# Altium footprint library POT_TH.PcbLib: 65 footprints (part 4 of 5)
Each footprint in its own frame and in the unit in brackets; x right, y up, seen from the top. Pads: shape width x height; smd on the part's side, far side on the other; paste and mask are expansions set on the pad; w line width, h text height; cw(c..) or ccw(c..) is an arc to the next point about the centre after c.
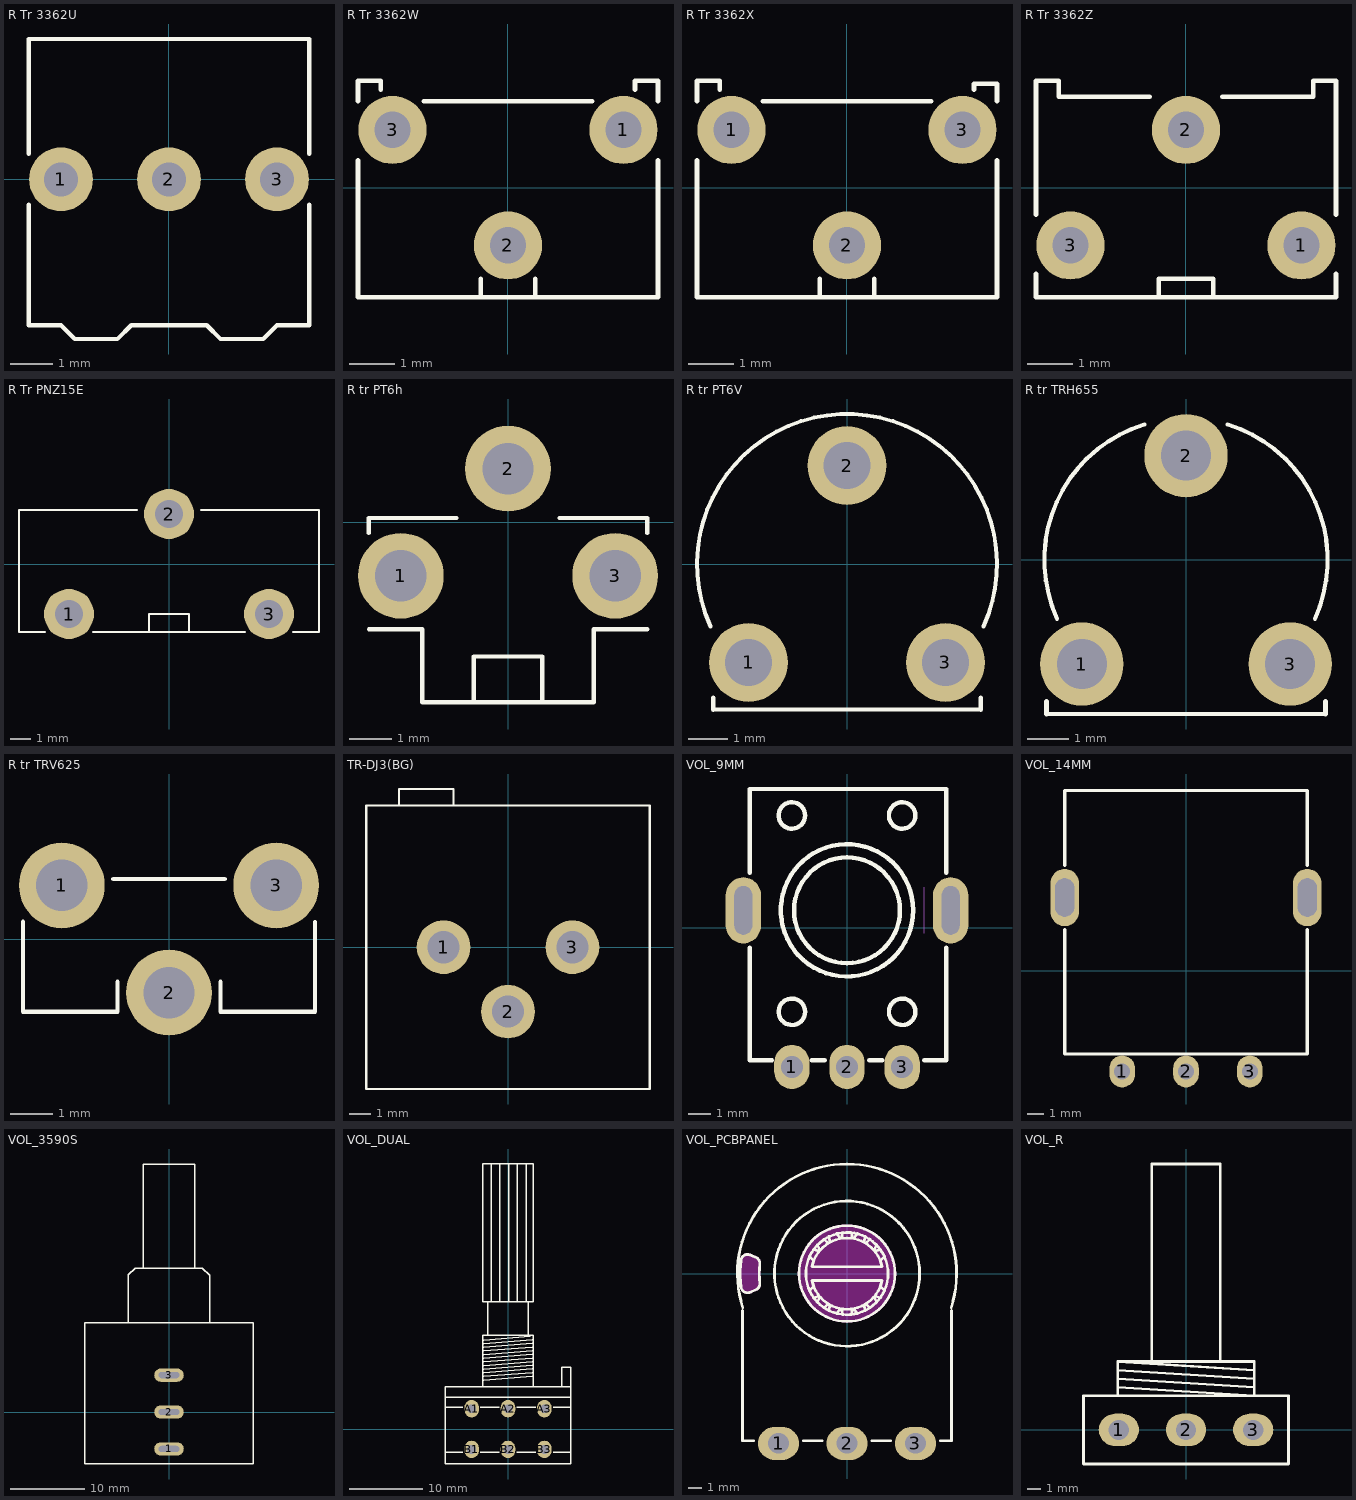
[diagram p3: the footprints below, top view; thin cyan lines are the x and y axes]

## R Tr 3362U [mm]
pads (3):
  round 1.5 hole 0.8: 1(-2.54,0) 2(0,0) 3(2.54,0)
Top Overlay:
  lines w0.1: -3.3,-0.6 -3.3,-3.429 -2.54,-3.429 -2.215,-3.754 -1.214,-3.754 -0.889,-3.429 0.889,-3.429 1.214,-3.754 2.215,-3.754 2.54,-3.429 3.3,-3.429 ; -3.3,0.6 -3.3,3.3 ; -3.3,3.3 3.3,3.3 ; 3.3,-3.429 3.3,-0.6 ; 3.3,0.6 3.3,3.3
3D body "Bourns 3362U.STEP": height 4.7, standoff -2.17, extent -3.3,-3.754 3.3,3.3

## R Tr 3362W [mm]
pads (3):
  round 1.5 hole 0.8: 1(2.54,1.27) 2(0,-1.27) 3(-2.54,1.27)
Top Overlay:
  lines w0.1: -3.3,0.6 -3.3,-2.41 3.3,-2.41 ; -3.3,1.9 -3.3,2.35 -2.8,2.35 -2.8,2.15 ; -1.85,1.9 1.85,1.9 ; -0.6,-2.41 -0.6,-2 ; 0.6,-2.41 0.6,-2 ; 2.794,2.15 2.794,2.35 3.3,2.35 3.3,1.9 ; 3.3,-2.41 3.3,0.6
3D body "Bourns 3362W.STEP": height 7.05, standoff -2.05, extent -3.3,-2.35 3.3,2.35

## R Tr 3362X [mm]
pads (3):
  round 1.5 hole 0.8: 1(-2.54,1.27) 2(0,-1.27) 3(2.54,1.27)
Top Overlay:
  lines w0.1: -3.3,0.6 -3.3,-2.41 3.3,-2.41 ; -3.3,1.9 -3.3,2.35 -2.8,2.35 -2.8,2.15 ; -1.85,1.9 1.85,1.9 ; -0.6,-2.41 -0.6,-2 ; 0.6,-2.41 0.6,-2 ; 2.794,2.15 2.794,2.29 3.3,2.29 ; 3.3,-2.41 3.3,0.6 ; 3.3,1.9 3.3,2.29
3D body "Bourns 3362X.STEP": height 7.05, standoff -2.05, extent -3.3,-2.35 3.3,2.35

## R Tr 3362Z [mm]
pads (3):
  round 1.5 hole 0.8: 1(2.54,-1.27) 2(0,1.27) 3(-2.54,-1.27)
Top Overlay:
  lines w0.1: -3.3,-1.9 -3.3,-2.41 3.3,-2.41 ; -3.3,-0.6 -3.3,2.35 -2.8,2.35 -2.8,2 -0.8,2 ; -0.6,-2.41 -0.6,-2 0.6,-2 0.6,-2.41 ; 0.8,2 2.8,2 2.8,2.35 3.3,2.35 3.3,-0.6 ; 3.3,-2.41 3.3,-1.9
3D body "Bourns 3362Z.STEP": height 7.05, standoff -2.05, extent -3.3,-2.35 3.3,2.35

## R Tr PNZ15E [mm]
pads (3):
  round 2.5 hole 1.4: 1(-5,-2.5) 2(0,2.5) 3(5,-2.5)
Top Overlay:
  lines w0.1: -6.2,-3.4 -7.5,-3.4 -7.5,2.7 -1.6,2.7 ; -3.8,-3.4 3.8,-3.4 ; -1,-3.4 -1,-2.5 1,-2.5 1,-3.4 ; 1.6,2.7 7.5,2.7 7.5,-3.4 6.2,-3.4
3D body "PTC15 G H01-1.STEP": height 17.5, standoff -4, extent -7.5,-3.35 7.5,2.649

## R tr PT6h [mm]
pads (3):
  round 2 hole 1.2: 1(-2.5,-1.25) 2(0,1.25) 3(2.5,-1.25)
Top Overlay:
  lines w0.1: -3.25,-0.25 -3.25,0.1 -1.2,0.1 ; -3.245,-2.5 -2,-2.5 -2,-4.2 2,-4.2 2,-2.5 3.25,-2.5 ; -0.8,-4.2 -0.8,-3.135 0.8,-3.135 0.8,-4.2 ; 1.2,0.1 3.25,0.1 3.25,-0.25
3D body "RM-063.STEP": height 10.5, standoff -0.81, extent -3.25,-4.2 3.25,1.429

## R tr PT6V [mm]
pads (3):
  round 2 hole 1.2: 1(-2.5,-2.5) 2(0,2.5) 3(2.5,-2.5)
Top Overlay:
  lines w0.1: -3.465,-1.584 cw(c0,0) 3.465,-1.584 ; -3.4,-3.7 3.4,-3.7
  lines w0.12: -3.4,-3.7 -3.4,-3.4 ; 3.4,-3.7 3.4,-3.4
3D body "R Tr PT6V.STEP": height 7.4, standoff -2, extent -3.25,-3.675 3.25,3.375

## R tr TRH655 [mm]
pads (3):
  round 2 hole 1.2: 1(-2.5,-2.5) 2(0,2.5) 3(2.5,-2.5)
Top Overlay:
  lines w0.1: -3.35,-3.7 3.35,-3.7 ; -3.092,-1.414 cw(c0,0) -1,3.25 ; 1,3.25 cw(c0,0) 3.092,-1.414
  lines w0.12: -3.35,-3.7 -3.35,-3.4 ; 3.35,-3.7 3.35,-3.4
3D body "R tr TRH655.STEP": height 6, standoff -2.53, extent -3.25,-3.675 3.25,3.375

## R tr TRV625 [mm]
pads (3):
  round 2 hole 1.2: 1(-2.5,1.25) 2(0,-1.25) 3(2.5,1.25)
Top Overlay:
  lines w0.1: -3.405,0.4 -3.405,-1.7 -1.2,-1.7 -1.2,-1 ; -1.3,1.4 1.3,1.4 ; 1.2,-1 1.2,-1.7 3.405,-1.7 3.405,0.395
3D body "PT6 Ver.STEP": height 8.4, standoff -1.91, extent -3.405,-1.73 3.405,1.42

## TR-DJ3(BG) [mm]
height 8
pads (3):
  round 2.5 hole 1.5 paste+0 mask+0.152: 1(-3,0) 2(0,-3) 3(3,0)
Top Overlay:
  lines w0.1: -5.08,6.604 -5.08,7.366 -2.54,7.366 -2.54,6.604 ; -6.604,-6.604 -6.604,6.604 6.604,6.604 6.604,-6.604 -6.604,-6.604
3D body "DJ-3(BG).STEP": height 8, standoff -2.5, extent -6.5,-6.5 6.5,7.5

## VOL_9MM [mm] "VOULME  9mm Alpha Alps, RV09ACF EVUF"
height 0.508
pads (5):
  oval 1.6x2 / inner round 1.4 / far side oval 1.6x2 hole 1: 1(-2.5,-6.3) 2(0,-6.3) 3(2.5,-6.3)
  oval 1.6x3 hole 0.8 slot 2.2 at 90 deg: ""(-4.7,0.8) ""(4.7,0.8)
Top Overlay:
  circle w0.2: c-2.5,-3.8 r0.6
  circle w0.2: c2.5,-3.8 r0.6
  circle w0.2: c-2.5,5.1 r0.6
  circle w0.2: c2.5,5.1 r0.6
  circle w0.2: c0,0.8 r3
  circle w0.2: c0,0.8 r2.4
  lines w0.2: -4.4,-0.9 -4.4,-6 -3.4,-6 ; -4.4,2.5 -4.4,6.3 4.5,6.3 4.5,2.5 ; -1.6,-6 -1,-6 ; 1,-6 1.6,-6 ; 3.5,-6 4.5,-6 4.5,-0.9
Mechanical 1:
  lines w0.008: 3.5,-0.25 3.5,1.85
3D body "User Library-RV09ACF-40_RK09K1130A5R.step": height 20.1, standoff -3.7, extent -4.902,-6.428 4.849,6.122

## VOL_14MM [mm] "VOULME  14mm, RV141F-40E3"
height 0.508
pads (5):
  oval 1.6x2 / inner round 1.4 / far side oval 1.6x2 hole 1: 1(-4,-6.3) 2(0,-6.3) 3(4,-6.3)
  oval 1.8x3.6 hole 1.2 slot 2.4 at 90 deg: ""(-7.6,4.6) ""(7.6,4.6)
Top Overlay:
  lines w0.2: -7.6,2.6 -7.6,-5.2 7.6,-5.2 7.6,2.6 ; -7.6,6.6 -7.6,11.3 7.6,11.3 7.6,6.6
3D body "User Library-RV141F-40E3-18BL-003.step": height 24.8, standoff -3.5, extent -8.198,-6.5 8.198,11.578

## VOL_3590S [mm] "VOULME 3590S"
height 0.508
pads (3):
  oval 4x1.8 hole 0.8 slot 2.8 at 0 deg: 1(0,-5) 2(0,0) 3(0,5)
Top Overlay:
  lines w0.2: -5.5,12.14 -5.5,18.6 -4.6,19.5 4.5,19.5 5.5,18.5 5.5,12.14 ; -3.5,19.5 -3.5,33.6 3.5,33.6 3.5,19.5 ; -11.4,-7.04 11.4,-7.04 11.4,12.1 -11.4,12.1 -11.4,-7.04
3D body "User Library-Bourns 3590S-2-502L.step": height 23.1, standoff -3.73, extent -11.3,-6.9 11.3,33.5

## VOL_DUAL [mm] "VOULME RIGHT ANGLE DUAL 3RP/1610G"
pads (6):
  oval 2x2.4 hole 1.2: A1(-5,2.8) A2(0,2.8) A3(5,2.8) B1(-5,-2.8) B2(0,-2.8) B3(5,-2.8)
Top Overlay:
  lines w0.2: -8.6,-3.2 -6.2,-3.2 ; -8.6,3 -6.2,3 ; -8.6,4.4 8.6,4.4 ; -3.8,-3.2 -1.2,-3.2 ; -3.8,3 -1.2,3 ; -3.5,5.8 -3.5,12.9 3.5,12.9 3.5,5.8 ; -3.3,6.727 3.3,7.252 ; -3.3,7.227 3.3,7.752 ; -3.3,7.727 3.3,8.252 ; -3.3,8.227 3.3,8.752 ; -3.3,8.727 3.3,9.252 ; -3.3,9.227 3.3,9.752 ; -3.3,9.727 3.3,10.252 ; -3.3,10.227 3.3,10.752 ; -3.3,10.727 3.3,11.252 ; -3.3,11.227 3.3,11.752 ; -3.3,11.727 3.3,12.252 ; -3.3,12.227 3.075,12.752 ; -2.8,12.927 -2.8,17.5 ; -2.3,17.5 -2.3,36.4 ; -1.1,17.5 -1.1,36.4 ; 0.1,17.5 0.1,36.4 ; 1.2,-3.2 3.8,-3.2 ; 1.2,3 3.8,3 ; 1.3,17.5 1.3,36.4 ; 2.5,17.5 2.5,36.4 ; 2.8,12.927 2.8,17.5 ; 6.2,-3.2 8.6,-3.2 ; 6.2,3 8.6,3 ; 7.4,5.8 7.4,8.5 8.6,8.5 8.6,5.8 -8.6,5.8 -8.6,-4.8 8.6,-4.8 8.6,6.3 ; -2.8,17.5 2.8,17.5 ; -2.8,17.5 -3.5,17.5 -3.5,36.4 3.5,36.4 3.5,17.5 2.8,17.5
3D body "SW3dPS-ALPHA-potentiometer stereo PCB mount.STEP": height 21.2, standoff -3.3, extent -8.5,-4.69 8.5,36.16

## VOL_PCBPANEL [mm] "VOULME VERTICAL"
height 0.508
pads (3):
  oval 3x2.4 hole 1.5: 1(-5,-12.4) 2(0,-12.4) 3(5,-12.4)
Top Overlay:
  circle w0.2: c0,0 r3
  circle w0.2: c0,0 r3.5
  circle w0.2: c0,0 r5.3
  lines w0.2: -7.742,-0.987 ccw(c-7.25,-0.9) -7.049,-1.358 -6.582,-1.15 ; -7.742,0.987 cw(c-7.25,0.9) -7.049,1.358 -6.582,1.15 ; -7.738,-0.978 cw(c0,0) -7.737,0.986 ; -7.62,-2.7 -7.62,-12.2 -6.8,-12.2 ; -7.608,-2.472 cw(c0,0) 7.608,-2.472 ; -6.584,-1.147 ccw(c-6.865,-0.734) -6.366,-0.708 ; -6.584,1.147 cw(c-6.865,0.734) -6.366,0.708 ; -6.361,-0.707 cw(c0,0) -6.361,0.707 ; -3.2,-12.2 -1.8,-12.2 ; -2.748,-1.24 -2.452,-0.954 ; -2.748,1.24 -2.452,0.954 ; -2.55,-0.51 ccw(c0,0) 2.55,-0.51 ; -2.55,0.51 cw(c0,0) 2.55,0.51 ; -2.5,-0.5 2.5,-0.5 ; -2.5,0.5 2.5,0.5 ; -2.448,-1.76 -2.052,-1.646 ; -2.448,1.76 -2.052,1.646 ; -2.158,-2.105 -1.978,-1.735 ; -2.158,2.105 -1.978,1.735 ; -1.699,-2.491 -1.365,-2.249 ; -1.699,2.491 -1.365,2.249 ; -1.308,-2.716 -1.265,-2.306 ; -1.308,2.716 -1.265,2.306 ; -0.744,-2.922 -0.513,-2.58 ; -0.744,2.922 -0.513,2.58 ; -0.4,-2.6 -0.3,-3 ; -0.4,2.6 -0.3,3 ; 0.3,-3 0.4,-2.6 ; 0.3,3 0.4,2.6 ; 0.513,-2.58 0.744,-2.922 ; 0.513,2.58 0.744,2.922 ; 1.265,-2.306 1.308,-2.716 ; 1.265,2.306 1.308,2.716 ; 1.365,-2.249 1.699,-2.491 ; 1.365,2.249 1.699,2.491 ; 1.8,-12.2 3.2,-12.2 ; 1.978,-1.735 2.158,-2.105 ; 1.978,1.735 2.158,2.105 ; 2.052,-1.646 2.448,-1.76 ; 2.052,1.646 2.448,1.76 ; 2.452,-0.954 2.748,-1.24 ; 2.452,0.954 2.748,1.24 ; 6.8,-12.2 7.62,-12.2 7.62,-2.7
Keep-Out Layer:
  board cut-out: -7.742,-0.987 -7.733,-1.043 -7.688,-1.147 -7.622,-1.239 -7.536,-1.314 -7.436,-1.368 -7.326,-1.397 -7.213,-1.402 -7.101,-1.381 -7.049,-1.358 -6.582,-1.15 -6.584,-1.147 -6.53,-1.111 -6.446,-1.014 -6.388,-0.898 -6.362,-0.772 -6.366,-0.708 -6.361,-0.707 -6.378,-0.531 -6.398,-0.177 -6.398,0.177 -6.378,0.531 -6.361,0.707 -6.366,0.708 -6.362,0.772 -6.388,0.898 -6.446,1.014 -6.53,1.111 -6.584,1.147 -6.582,1.15 -7.049,1.358 -7.101,1.381 -7.213,1.402 -7.326,1.397 -7.436,1.368 -7.536,1.314 -7.622,1.239 -7.688,1.147 -7.733,1.043 -7.742,0.987 -7.737,0.986 -7.769,0.741 -7.802,0.247 -7.803,-0.248 -7.773,-0.741
  board cut-out: 0,-3.5 -0.229,-3.5 -0.684,-3.44 -1.127,-3.321 -1.551,-3.146 -1.949,-2.916 -2.313,-2.637 -2.637,-2.313 -2.916,-1.949 -3.146,-1.551 -3.321,-1.127 -3.44,-0.684 -3.5,-0.229 -3.5,0 -3.5,0.229 -3.44,0.684 -3.321,1.127 -3.146,1.551 -2.916,1.949 -2.637,2.313 -2.313,2.637 -1.949,2.916 -1.551,3.146 -1.127,3.321 -0.684,3.44 -0.229,3.5 0,3.5 0.229,3.5 0.684,3.44 1.127,3.321 1.551,3.146 1.949,2.916 2.313,2.637 2.637,2.313 2.916,1.949 3.146,1.551 3.321,1.127 3.44,0.684 3.5,0.229 3.5,0 3.5,-0.229 3.44,-0.684 3.321,-1.127 3.146,-1.551 2.916,-1.949 2.637,-2.313 2.313,-2.637 1.949,-2.916 1.551,-3.146 1.127,-3.321 0.684,-3.44 0.229,-3.5
Keep-Out Layer:
  circle w0.2: c0,0 r3.5
  lines w0.2: -7.742,-0.987 ccw(c-7.25,-0.9) -7.049,-1.358 -6.582,-1.15 ; -7.742,0.987 cw(c-7.25,0.9) -7.049,1.358 -6.582,1.15 ; -7.738,-0.978 cw(c0,0) -7.737,0.986 ; -6.584,-1.147 ccw(c-6.865,-0.734) -6.366,-0.708 ; -6.584,1.147 cw(c-6.865,0.734) -6.366,0.708 ; -6.361,-0.707 cw(c0,0) -6.361,0.707
3D body "volome cover2.STEP": height 22.5, standoff 2.5, extent -7.56,-7.585 9.551,7.585
3D body "Standard Potentiometer - Vertical (No Value).STEP": height 10.77, standoff -15.23, extent -8.575,-12.65 8.625,8.6

## VOL_R [mm] "VOULME RIGHT ANGLE"
height 0.508
pads (3):
  oval 3x2.4 hole 1.5: 1(-5,0) 2(0,0) 3(5,0)
Top Overlay:
  lines w0.2: -5.08,2.54 -5.08,5.08 ; -5.08,3.175 5.08,2.54 5.08,5.08 -5.08,5.08 ; -5.08,3.81 5.08,3.175 ; -5.08,4.445 5.08,3.81 ; -2.54,5.08 -2.54,19.781 2.54,19.781 2.54,5.08 ; 5.08,4.445 -5.08,5.08 ; -7.62,-2.54 7.62,-2.54 7.62,2.54 -7.62,2.54 -7.62,-2.54
3D body "volome cover2.STEP": height 24.54, standoff 2.14, extent -10.761,7.8 10.932,27.8
3D body "SW3dPS-Pot.STEP": height 20.64, standoff -4, extent -7.947,-4.998 7.801,20.56